# Altium integrated library vh_altium_library.intLib: 963 symbols (part 1 of 5)
Pins are listed as number, name and electrical type; pins without a type are passive.

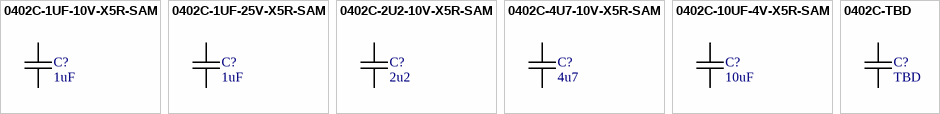
[diagram p0: symbols 0402C-1UF-10V-X5R-SAM to 0402C-TBD]

## 0402C-1UF-10V-X5R-SAM
designator C?, comment 1uF
CAPACITOR 0402 CERAMIC; Reel: C18
footprint 0402C-GENERIC
pins: 1, 2

## 0402C-1UF-25V-X5R-SAM
designator C?, comment 1uF
CAPACITOR 0402 CERAMIC; Reel: C49
footprint 0402C-GENERIC
pins: 1, 2

## 0402C-2U2-10V-X5R-SAM
designator C?, comment 2u2
CAPACITOR 0402 CERAMIC; Reel: C16
footprint 0402C-GENERIC
pins: 1, 2

## 0402C-4U7-10V-X5R-SAM
designator C?, comment 4u7
CAPACITOR 0402 CERAMIC; Reel: C48
footprint 0402C-GENERIC
pins: 1, 2

## 0402C-10UF-4V-X5R-SAM
designator C?, comment 10uF
CAPACITOR 0402 CERAMIC; Reel: C47
footprint 0402C-GENERIC
pins: 1, 2

## 0402C-TBD
designator C?, comment TBD
CAPACITOR 0402 CERAMIC
footprint 0402C-TBD (Footprint not found)
pins: 1, 2


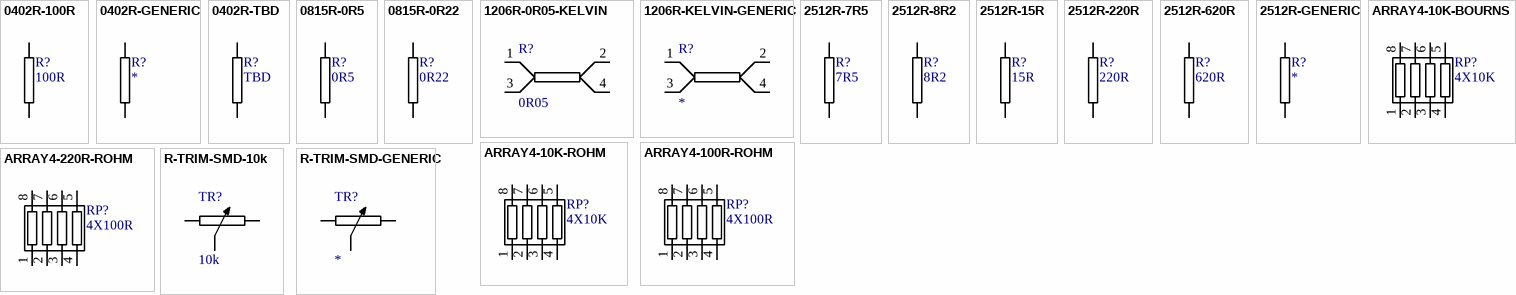
[diagram p1: symbols 0402R-100R to R-TRIM-SMD-GENERIC]

## 0402R-100R
designator R?, comment 100R
RESISTOR 0402 GENERIC
footprint 0402R-GENERIC
pins: 1, 2

## 0402R-GENERIC
designator R?
RESISTOR 0402 GENERIC
footprint 0402R-GENERIC
pins: 1, 2

## 0402R-TBD
designator R?, comment TBD
RESISTOR 0402 VALUE TO BE DETERMINED
footprint 0402R-TBD
pins: 1, 2

## 0815R-0R5
designator R?, comment 0R5
GENERIC RESISTOR 0815 1WATT
footprint 0815R-GENERIC (0815 RESISTOR 1 WATT)
pins: 1, 2

## 0815R-0R22
designator R?, comment 0R22
GENERIC RESISTOR 0815 1WATT
footprint 0815R-GENERIC (0815 RESISTOR 1 WATT)
pins: 1, 2

## 1206R-0R05-KELVIN
designator R?, comment 0R05
RESISTOR 1206 KELVIN; Manufacturer: Ohmite; Manufacturer Part Number: LVK12R050DER; Description: RES .05 OHM 1/2W .5% 4-TERM 1206; Supplier 1: Digi-Key; Supplier Part Number 1: LVK12R050DERTR-ND
footprint 1206-KELVIN-GENERIC
pins: 1, 2, 3, 4

## 1206R-KELVIN-GENERIC
designator R?
RESISTOR 1206 KELVIN
footprint 1206-KELVIN-GENERIC
pins: 1, 2, 3, 4

## 2512R-7R5
designator R?, comment 7R5
GENERIC RESISTOR 2512; Manufacturer Part Number: CRCW25127R50JNEG; Manufacturer: Vishay/Dale; REEL: R20; Description: RES 7.5 OHM 1W 5% 2512 SMD; Supplier 1: Digi-Key; Supplier Part Number 1: 541-7.5XDKR-ND
footprint 2512R-GENERIC
pins: 1, 2

## 2512R-8R2
designator R?, comment 8R2
GENERIC RESISTOR 2512; Manufacturer: Vishay/Dale; Manufacturer Part Number: CRCW25128R20JNEG; REEL: R10; Description: RES 8.2 OHM 1W 5% 2512 SMD; Supplier 1: Digi-Key; Supplier Part Number 1: 541-8.2XCT-ND
footprint 2512R-GENERIC
pins: 1, 2

## 2512R-15R
designator R?, comment 15R
GENERIC RESISTOR 2512; Manufacturer: Vishay/Dale; Manufacturer Part Number: CRCW251215R0JNEG; Reel: R11; Description: RES 15 OHM 1W 5% 2512 SMD; Supplier 1: Digi-Key; Supplier Part Number 1: 541-15XTR-ND
footprint 2512R-GENERIC
pins: 1, 2

## 2512R-220R
designator R?, comment 220R
GENERIC RESISTOR 2512; Manufacturer Part Number: CRCW2512220RJNEG; Manufacturer: Vishay/Dale; REEL: R19; Description: RES 220 OHM 1W 5% 2512 SMD; Supplier 1: Digi-Key; Supplier Part Number 1: 541-220XTR-ND
footprint 2512R-GENERIC
pins: 1, 2

## 2512R-620R
designator R?, comment 620R
GENERIC RESISTOR 2512; Manufacturer: Vishay/Dale; Manufacturer Part Number: CRCW2512620RJNEG; Description: RES 620 OHM 1W 5% 2512 SMD; Reel: R12; Supplier 1: Digi-Key; Supplier Part Number 1: 541-620XCT-ND
footprint 2512R-GENERIC
pins: 1, 2

## 2512R-GENERIC
designator R?
GENERIC RESISTOR 2512; Reel: *
footprint 2512R-GENERIC
pins: 1, 2

## ARRAY4-10K-BOURNS
designator RP?, comment 4X10K
GENERIC RESISTOR ARRAY 4X INDEPENDENT; Reel: RA4
footprint 1206-ARRAY-4-GENERIC
pins: 1, 2, 3, 4, 5, 6, 7, 8

## ARRAY4-10K-ROHM
designator RP?, comment 4X10K
GENERIC RESISTOR ARRAY 4X INDEPENDENT; Manufacturer: Rohm Semiconductor; Manufacturer Part Number: MNR14E0APJ103; Description: RES ARRAY 10K OHM 8TERM 4RES SMD; Temperature Coefficient: ±200ppm/°C; Resistance In Ohms: 10.0K; Number of Resistors: 4; Tolerance: ±5%; Circuit Type: Isolated; Power Per Element: 62.5mW; Reel: RA2; Supplier 1: Digi-Key; Supplier: Digi-Key; Category: Resistors; RoHS: RoHS Compliant; Package / Case: 0603 x 4 Convex (1608 metric); Packaging: Tape & Reel (TR); Mounting Type: Surface Mount; Number of Pins: 8; Supplier Part Number 1: MNR14103RTR-ND; Supplier Part Number: MNR14103RTR-ND
footprint 1206-ARRAY-4-GENERIC
pins: 1, 2, 3, 4, 5, 6, 7, 8

## ARRAY4-100R-ROHM
designator RP?, comment 4X100R
GENERIC RESISTOR ARRAY 4X INDEPENDENT; Manufacturer Part Number: MNR14E0APJ101; Manufacturer: Rohm Semiconductor; Description: RES ARRAY 100 OHM 8TERM 4RES SMD; Power Per Element: 62.5mW; Tolerance: ±5%; Number of Resistors: 4; Circuit Type: Isolated; Resistance In Ohms: 100; Temperature Coefficient: ±200ppm/°C; Reel: RA1; Supplier 1: Digi-Key; Category: Resistors; Number of Pins: 8; Mounting Type: Surface Mount; Supplier: Digi-Key; Package / Case: 0603 x 4 Convex (1608 metric); Packaging: Tape & Reel (TR); RoHS: RoHS Compliant; Supplier Part Number 1: MNR14101RTR-ND; Supplier Part Number: MNR14101RTR-ND
footprint 1206-ARRAY-4-GENERIC
pins: 1, 2, 3, 4, 5, 6, 7, 8

## ARRAY4-220R-ROHM
designator RP?, comment 4X100R
GENERIC RESISTOR ARRAY 4X INDEPENDENT; Manufacturer: Rohm Semiconductor; Manufacturer Part Number: MNR14E0APJ221; Description: RES ARRAY 220 OHM 8TERM 4RES SMD; Number of Resistors: 4; Resistance In Ohms: 220; Circuit Type: Isolated; Power Per Element: 62.5mW; Tolerance: ±5%; Temperature Coefficient: ±200ppm/°C; Reel: RA3; Supplier 1: Digi-Key; Category: Resistors; Supplier: Digi-Key; Number of Pins: 8; Packaging: Tape & Reel (TR); RoHS: RoHS Compliant; Mounting Type: Surface Mount; Package / Case: 0603 x 4 Convex (1608 metric); Supplier Part Number 1: MNR14221RTR-ND; Supplier Part Number: MNR14221RTR-ND
footprint 1206-ARRAY-4-GENERIC
pins: 1, 2, 3, 4, 5, 6, 7, 8

## R-TRIM-SMD-10k
designator TR?, comment 10k
GENERIC SMD TRIMMER; Manufacturer Part Number: 3224X-1-103E; Manufacturer: Bourns Inc.; Tolerance: ±10%; Power (Watts): 0.25W, 1/4W; Adjustment Type: Top Adjustment; Resistive Material: Cermet; Resistance In Ohms: 10.0K; Temperature Coefficient: ±100ppm/°C; Description: TRIMPOT 10K OHM 4MM CERMET SMD; Number of Turns: 11; Supplier 1: Digi-Key; Supplier Part Number 1: 3224X-1-103ETR-ND; Supplier: Digi-Key; Category: Potentiometers, Variable Resistors; Supplier Part Number: 3224X-1-103ETR-ND; Package / Case: Square - 0.190" L x 0.139" W x 0.200" H (4.80mm x 3.50mm x 5.10mm); Mounting Type: Surface Mount; RoHS: RoHS Compliant; Taper: -; Packaging: Tape & Reel (TR)
footprint TRIM3224
pins: 1, 2, W

## R-TRIM-SMD-GENERIC
designator TR?
GENERIC SMD TRIMMER
footprint TRIM3224
pins: 1, 2, W


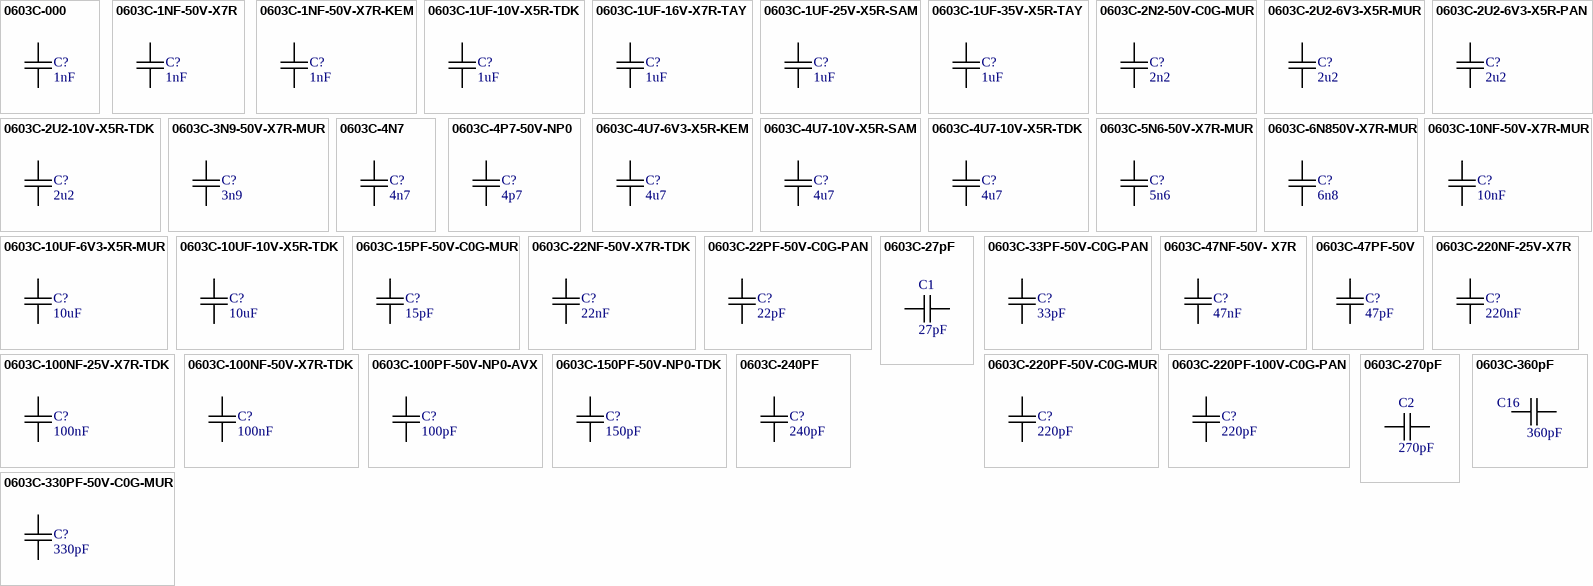
[diagram p2: symbols 0603C-000 to 0603C-360pF]

## 0603C-000
designator C?, comment 1nF
CAPACITOR 0603 CERAMIC
footprint 0603C-GENERIC (CAPACITOR 0805)
pins: 1, 2

## 0603C-1NF-50V-X7R
designator C?, comment 1nF
CAPACITOR 0603 CERAMIC
footprint 0603C-GENERIC (CAPACITOR 0805)
pins: 1, 2

## 0603C-1NF-50V-X7R-KEM
designator C?, comment 1nF
CAPACITOR 0603 CERAMIC; Reel: C45; Supplier 1: Digi-Key; Supplier Part Number 1: 399-1082-2-ND
footprint 0603C-GENERIC (CAPACITOR 0805)
pins: 1, 2

## 0603C-1UF-10V-X5R-TDK
designator C?, comment 1uF
CAPACITOR 0603 CERAMIC; Manufacturer: TDK Corporation; Manufacturer Part Number: C1608X5R1A105K; Reel: C23; Description: CAP CER 1.0UF 10V X5R 10% 0603; Supplier 1: Digi-Key; Supplier Part Number 1: 445-1321-2-ND
footprint 0603C-GENERIC (CAPACITOR 0805)
pins: 1, 2

## 0603C-1UF-16V-X7R-TAY
designator C?, comment 1uF
CAPACITOR 0603 CERAMIC; Manufacturer Part Number: EMK107B7105KA-T; Manufacturer: Taiyo Yuden; Reel: C37; Description: CAP CER 1.0UF 16V X7R 0603; Supplier 1: Digi-Key; Supplier Part Number 1: 587-1241-2-ND
footprint 0603C-GENERIC (CAPACITOR 0805)
pins: 1, 2

## 0603C-1UF-25V-X5R-SAM
designator C?, comment 1uF
CAPACITOR 0603 CERAMIC; Reel: C17
footprint 0603C-GENERIC (CAPACITOR 0805)
pins: 1, 2

## 0603C-1UF-35V-X5R-TAY
designator C?, comment 1uF
CAPACITOR 0603 CERAMIC; Manufacturer Part Number: GMK107BJ105KA-T; Manufacturer: Taiyo Yuden; Reel: C92; Description: CAP CER 1.0UF 35V X5R 0603; Supplier 1: Digi-Key; Supplier Part Number 1: 587-1437-2-ND
footprint 0603C-GENERIC (CAPACITOR 0603)
pins: 1, 2

## 0603C-2N2-50V-C0G-MUR
designator C?, comment 2n2
CAPACITOR 0603 CERAMIC; Reel: C4
footprint 0603C-GENERIC (CAPACITOR 0603)
pins: 1, 2

## 0603C-2U2-6V3-X5R-MUR
designator C?, comment 2u2
CAPACITOR 0603 CERAMIC; Reel: C20
footprint 0603C-2U2 (CAPACITOR 0603)
pins: 1, 2

## 0603C-2U2-6V3-X5R-PAN
designator C?, comment 2u2
CAPACITOR 0805 CERAMIC; Manufacturer Part Number: ECJ-1VB0J225K; Manufacturer: Panasonic - ECG; Description: CAP 2.2UF 6.3V CERAMIC X5R 0603; Supplier 1: Digi-Key; Supplier Part Number 1: PCC2273TR-ND; Reel: *
footprint 0805C-TBD (CAPACITOR 0805)
pins: 1, 2

## 0603C-2U2-10V-X5R-TDK
designator C?, comment 2u2
CAPACITOR 0603 CERAMIC; Manufacturer: TDK Corporation; Manufacturer Part Number: C1608X5R1A225K; Reel: C11; Description: CAP CER 2.2UF 10V X5R 0603; Supplier 1: Digi-Key; Supplier Part Number 1: 445-5166-2-ND
footprint 0603C-2U2 (CAPACITOR 0603)
pins: 1, 2

## 0603C-3N9-50V-X7R-MUR
designator C?, comment 3n9
CAPACITOR 0603 CERAMIC; Manufacturer Part Number: GRM188R71H392KA01D; Manufacturer: Murata Electronics North America; Reel: C39; Description: CAP CER 3900PF 50V 10% X7R 0603; Supplier 1: Digi-Key; Supplier Part Number 1: 490-1504-2-ND
footprint 0603C-GENERIC (CAPACITOR 0603)
pins: 1, 2

## 0603C-4N7
designator C?, comment 4n7
CAPACITOR 0603 CERAMIC; REEL: C83; Supplier 1: Digi-Key; Supplier Part Number 1: 445-5086-2-ND
footprint 0603C-TBD (CAPACITOR 0603 TBD)
pins: 1, 2

## 0603C-4P7-50V-NP0
designator C?, comment 4p7
CAPACITOR 0603 CERAMIC
footprint 0603C-GENERIC (CAPACITOR 0603)
pins: 1, 2

## 0603C-4U7-6V3-X5R-KEM
designator C?, comment 4u7
CAPACITOR 0603 CERAMIC; Reel: C36
footprint 0603C-GENERIC (CAPACITOR 0603)
pins: 1, 2

## 0603C-4U7-10V-X5R-SAM
designator C?, comment 4u7
CAPACITOR 0603 CERAMIC; Reel: C46
footprint 0603C-GENERIC (CAPACITOR 0603)
pins: 1, 2

## 0603C-4U7-10V-X5R-TDK
designator C?, comment 4u7
CAPACITOR 0603 CERAMIC; Manufacturer Part Number: C1608X5R1A475K; Manufacturer: TDK Corporation; Reel: C13; Temperature Coefficient: X5R; Description: CAP CER 4.7UF 10V X5R 0603; Voltage - Rated: 10V; Capacitance: 4.7µF; Tolerance: ±10%; Supplier 1: Digi-Key; Mounting Type: Surface Mount, MLCC; Operating Temperature: -55°C ~ 85°C; Features: General Purpose; Lead Spacing: -; Package / Case: 0603 (1608 metric); Thickness: 0.80mm; Packaging: Tape & Reel (TR); Category: Capacitors; Supplier: Digi-Key; RoHS: RoHS Compliant; Supplier Part Number 1: 445-5170-2-ND; Supplier Part Number: 445-5170-2-ND
footprint 0603C-GENERIC (CAPACITOR 0603)
pins: 1, 2

## 0603C-5N6-50V-X7R-MUR
designator C?, comment 5n6
CAPACITOR 0603 CERAMIC; Manufacturer: Murata Electronics North America; Manufacturer Part Number: GRM188R71H562KA01D; Reel: C34; Description: CAP CER 5600PF 50V 10% X7R 0603; Supplier 1: Digi-Key; Supplier Part Number 1: 490-1507-2-ND
footprint 0603C-GENERIC (CAPACITOR 0603)
pins: 1, 2

## 0603C-6N850V-X7R-MUR
designator C?, comment 6n8
CAPACITOR 0603 CERAMIC; Manufacturer: Murata Electronics North America; Manufacturer Part Number: GRM188R71H682KA01D; Reel: C35; Description: CAP CER 6800PF 50V 10% X7R 0603; Supplier 1: Digi-Key; Supplier Part Number 1: 490-1508-2-ND
footprint 0603C-GENERIC (CAPACITOR 0603)
pins: 1, 2

## 0603C-10NF-50V-X7R-MUR
designator C?, comment 10nF
CAPACITOR 0603 CERAMIC; Manufacturer Part Number: GRM188R71H103KA01D; Manufacturer: Murata Electronics North America; Reel: C22; Description: CAP CER 10000PF 50V 10% X7R 0603; Supplier 1: Digi-Key; Supplier Part Number 1: 490-1512-2-ND
footprint 0603C-GENERIC (CAPACITOR 0603)
pins: 1, 2

## 0603C-10UF-6V3-X5R-MUR
designator C?, comment 10uF
CAPACITOR 0603 CERAMIC; Manufacturer: Murata Electronics North America; Manufacturer Part Number: GRM188R60J106ME47D; Reel: C24; Description: CAP CER 10UF 6.3V X5R 0603; Supplier 1: Digi-Key; Supplier Part Number 1: 490-3896-2-ND
footprint 0603C-GENERIC (CAPACITOR 0603)
pins: 1, 2

## 0603C-10UF-10V-X5R-TDK
designator C?, comment 10uF
CAPACITOR 0603 CERAMIC; Manufacturer Part Number: C1608X5R0J106M; Manufacturer: TDK Corporation; Reel: C31; Description: CAP CER 10UF 6.3V X5R 20% 0603; Supplier 1: Digi-Key; Supplier Part Number 1: 445-4112-2-ND
footprint 0603C-GENERIC (CAPACITOR 0805)
pins: 1, 2

## 0603C-15PF-50V-C0G-MUR
designator C?, comment 15pF
CAPACITOR 0603 CERAMIC; Reel: C2
footprint 0603C-GENERIC (CAPACITOR 0805)
pins: 1, 2

## 0603C-22NF-50V-X7R-TDK
designator C?, comment 22nF
CAPACITOR 0603 CERAMIC; Reel: C89; Supplier 1: Digi-Key; Supplier Part Number 1: 445-1312-2-ND
footprint 0603C-GENERIC (CAPACITOR 0805)
pins: 1, 2

## 0603C-22PF-50V-C0G-PAN
designator C?, comment 22pF
CAPACITOR 0603 CERAMIC; Manufacturer Part Number: ECJ-1VC1H220J; Manufacturer: Panasonic - ECG; Reel: C10; Tolerance: ±5%; Temperature Coefficient: C0G, NP0; Voltage - Rated: 50V; Description: CAP CERAMIC 22PF 50V 0603 SMD; Supplier 1: Digi-Key; Features: General Purpose; Lead Spacing: -; Supplier: Digi-Key; Capacitance: 22pF; Packaging: Tape & Reel (TR); Mounting Type: Surface Mount, MLCC; RoHS: RoHS Compliant; Operating Temperature: -55°C ~ 125°C; Thickness: 0.80mm; Package / Case: 0603 (1608 metric); Category: Capacitors; Supplier Part Number 1: PCC220ACVTR-ND; Supplier Part Number: PCC220ACVTR-ND
footprint 0603C-GENERIC (CAPACITOR 0805)
pins: 1, 2

## 0603C-27pF
designator C1, comment 27pF
CAPACITOR 0603 CERAMIC; REEL: C98; Supplier 1: Digi-Key; Supplier Part Number 1: 445-1274-2-ND
footprint 0603C-GENERIC (CAPACITOR 0603)
pins: 1, 2

## 0603C-33PF-50V-C0G-PAN
designator C?, comment 33pF
CAPACITOR 0603 CERAMIC; Reel: C42
footprint 0603C-GENERIC (CAPACITOR 0805)
pins: 1, 2

## 0603C-47NF-50V- X7R
designator C?, comment 47nF
CAPACITOR 0603 CERAMIC
footprint 0603C-47NF (CAPACITOR 0603)
pins: 1, 2

## 0603C-47PF-50V
designator C?, comment 47pF
CAPACITOR 0603 CERAMIC; REEL: C82; Supplier 1: Digi-Key; Supplier Part Number 1: PCC470ACVTR-ND
footprint 0603C-TBD (CAPACITOR 0805)
pins: 1, 2

## 0603C-100NF-25V-X7R-TDK
designator C?, comment 100nF
CAPACITOR 0603 CERAMIC; Manufacturer Part Number: C1608X7R1E104K; Manufacturer: TDK Corporation; Reel: C12; Description: CAP CER .10UF 25V X7R 10% 0603; Supplier 1: Digi-Key; Supplier Part Number 1: 445-1316-2-ND
footprint 0603C-GENERIC (CAPACITOR 0805)
pins: 1, 2

## 0603C-100NF-50V-X7R-TDK
designator C?, comment 100nF
CAPACITOR 0603 CERAMIC; Manufacturer Part Number: C1608X7R1H103K; Manufacturer: TDK Corporation; Temperature Coefficient: X7R; Tolerance: ±10%; Voltage - Rated: 50V; Capacitance: 10000pF; Description: CAP CER 10000PF 50V X7R 10% 0603; Reel: C68; RoHS: RoHS Compliant; Lead Spacing: -; Package / Case: 0603 (1608 metric); Features: General Purpose; Packaging: Tape & Reel (TR); Thickness: 0.80mm; Operating Temperature: -55°C ~ 125°C; Mounting Type: Surface Mount, MLCC; Category: Capacitors; Supplier 1: Digi-Key; Supplier Part Number 1: 445-1314-2-ND
footprint 0603C-GENERIC (CAPACITOR 0805)
pins: 1, 2

## 0603C-100PF-50V-NP0-AVX
designator C?, comment 100pF
CAPACITOR 0603 CERAMIC; Reel: C44
footprint 0603C-GENERIC (CAPACITOR 0805)
pins: 1, 2

## 0603C-150PF-50V-NP0-TDK
designator C?, comment 150pF
CAPACITOR 0603 CERAMIC; Supplier 1: Digi-Key; Supplier Part Number 1: 445-1283-2-ND
footprint 0603C-GENERIC (CAPACITOR 0805)
pins: 1, 2

## 0603C-220NF-25V-X7R
designator C?, comment 220nF
CAPACITOR 0603 CERAMIC; Manufacturer: TDK Corporation; Manufacturer Part Number: C1608X7R1E224K; Temperature Coefficient: X7R; Tolerance: ±10%; Capacitance: 0.22µF; Voltage - Rated: 25V; Description: CAP CER .22UF 25V X7R 0603; REEL: C93; Supplier 1: Digi-Key; Supplier Part Number 1: 445-5191-2-ND; Lead Spacing: -; Packaging: Tape & Reel (TR); Category: Capacitors; Package / Case: 0603 (1608 Metric); Thickness: 0.80mm; Operating Temperature: -55°C ~ 125°C; Features: General Purpose; Supplier Part Number: 445-5191-2-ND; RoHS: RoHS Compliant; Supplier: Digi-Key; Mounting Type: Surface Mount, MLCC
footprint 0603C-GENERIC (CAPACITOR 0805)
pins: 1, 2

## 0603C-220PF-50V-C0G-MUR
designator C?, comment 220pF
CAPACITOR 0603 CERAMIC; Manufacturer: Murata Electronics North America; Manufacturer Part Number: GRM1885C1H221JA01D; Reel: C15; Tolerance: ±5%; Temperature Coefficient: C0G, NP0; Voltage - Rated: 50V; Description: CAP CER 220PF 50V 5% C0G 0603; Supplier 1: Digi-Key; RoHS: RoHS Compliant; Lead Spacing: -; Capacitance: 220pF; Supplier: Digi-Key; Features: General Purpose; Package / Case: 0603 (1608 metric); Packaging: Tape & Reel (TR); Operating Temperature: -55°C ~ 125°C; Category: Capacitors; Thickness: 0.80mm; Mounting Type: Surface Mount, MLCC; Supplier Part Number 1: 490-1435-2-ND; Supplier Part Number: 490-1435-2-ND
footprint 0603C-GENERIC (CAPACITOR 0805)
pins: 1, 2

## 0603C-220PF-100V-C0G-PAN
designator C?, comment 220pF
CAPACITOR 0603 CERAMIC; Reel: C41
footprint 0603C-GENERIC (CAPACITOR 0805)
pins: 1, 2

## 0603C-240PF
designator C?, comment 240pF
CAPACITOR 0603 CERAMIC; REEL: C95; Supplier 1: Digi-Key; Supplier Part Number 1: 490-1436-2-ND
footprint 0603C-TBD (CAPACITOR 0805)
pins: 1, 2

## 0603C-270pF
designator C2, comment 270pF
CAPACITOR 0603 CERAMIC; REEL: C99; Supplier 1: Digi-Key; Supplier Part Number 1: 490-1485-2-ND
footprint 0603C-GENERIC (CAPACITOR 0603)
pins: 1, 2

## 0603C-330PF-50V-C0G-MUR
designator C?, comment 330pF
CAPACITOR 0603 CERAMIC; Reel: C21; Supplier 1: Digi-Key; Supplier Part Number 1: 490-1439-2-ND
footprint 0603C-GENERIC (CAPACITOR 0805)
pins: 1, 2

## 0603C-360pF
designator C16, comment 360pF
CAPACITOR 0603 CERAMIC; REEL: C101; Supplier 1: Digi-Key; Supplier Part Number 1: 445-5067-2-ND
footprint 0603C-GENERIC (CAPACITOR 0603)
pins: 1, 2

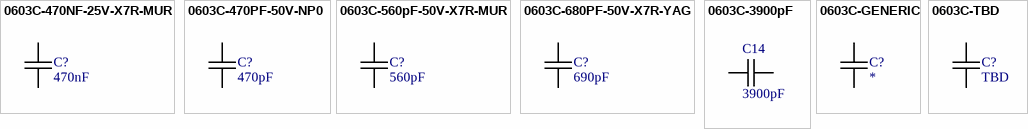
[diagram p3: symbols 0603C-470NF-25V-X7R-MUR to 0603C-TBD]

## 0603C-470NF-25V-X7R-MUR
designator C?, comment 470nF
CAPACITOR 0603 CERAMIC; Manufacturer: Murata Electronics North America; Manufacturer Part Number: GRM188R71E474KA12D; Reel: C14; Temperature Coefficient: X7R; Description: CAP CER .47UF 25V X7R 0603; Capacitance: 0.47µF; Voltage - Rated: 25V; Tolerance: ±10%; Supplier 1: Digi-Key; RoHS: RoHS Compliant; Features: General Purpose; Operating Temperature: -55°C ~ 125°C; Packaging: Tape & Reel (TR); Thickness: 0.80mm; Mounting Type: Surface Mount, MLCC; Lead Spacing: -; Category: Capacitors; Package / Case: 0603 (1608 metric); Supplier: Digi-Key; Supplier Part Number 1: 490-3291-2-ND; Supplier Part Number: 490-3291-2-ND
footprint 0603C-GENERIC (CAPACITOR 0805)
pins: 1, 2

## 0603C-470PF-50V-NP0
designator C?, comment 470pF
CAPACITOR 0603 CERAMIC; Manufacturer Part Number: 06035C471KAT2A; Manufacturer: AVX Corporation; Reel: C66; Description: CAP CERM 470PF 10% 50V X7R 0603; Supplier 1: Digi-Key; Supplier Part Number 1: 478-1211-2-ND
footprint 0603C-470P (CAPACITOR 0603)
pins: 1, 2

## 0603C-560pF-50V-X7R-MUR
designator C?, comment 560pF
CAPACITOR 0603 CERAMIC; REEL: C94; Supplier 1: Digi-Key; Supplier Part Number 1: 490-1490-2-ND
footprint 0603C-TBD (CAPACITOR 0805)
pins: 1, 2

## 0603C-680PF-50V-X7R-YAG
designator C?, comment 690pF
CAPACITOR 0603 CERAMIC; Manufacturer: Yageo; Manufacturer Part Number: CC0603KRX7R9BB681; Reel: C43; Description: CAP 680PF 50V CERAMIC X7R 0603; Supplier 1: Digi-Key; Supplier Part Number 1: 311-1188-2-ND
footprint 0603C-GENERIC (CAPACITOR 0805)
pins: 1, 2

## 0603C-3900pF
designator C14, comment 3900pF
CAPACITOR 0603 CERAMIC; REEL: C71; Supplier 1: Digi-Key; Supplier Part Number 1: PCC1779DKR-ND
footprint 0603C-GENERIC (CAPACITOR 0603)
pins: 1, 2

## 0603C-GENERIC
designator C?
CAPACITOR 0603 CERAMIC GENERIC
footprint 0603C-GENERIC (CAPACITOR 0805)
pins: 1, 2

## 0603C-TBD
designator C?, comment TBD
CAPACITOR 0603 CERAMIC VALUE TO BE DETERMINED; REEL: *
footprint 0603C-TBD (CAPACITOR 0805)
pins: 1, 2


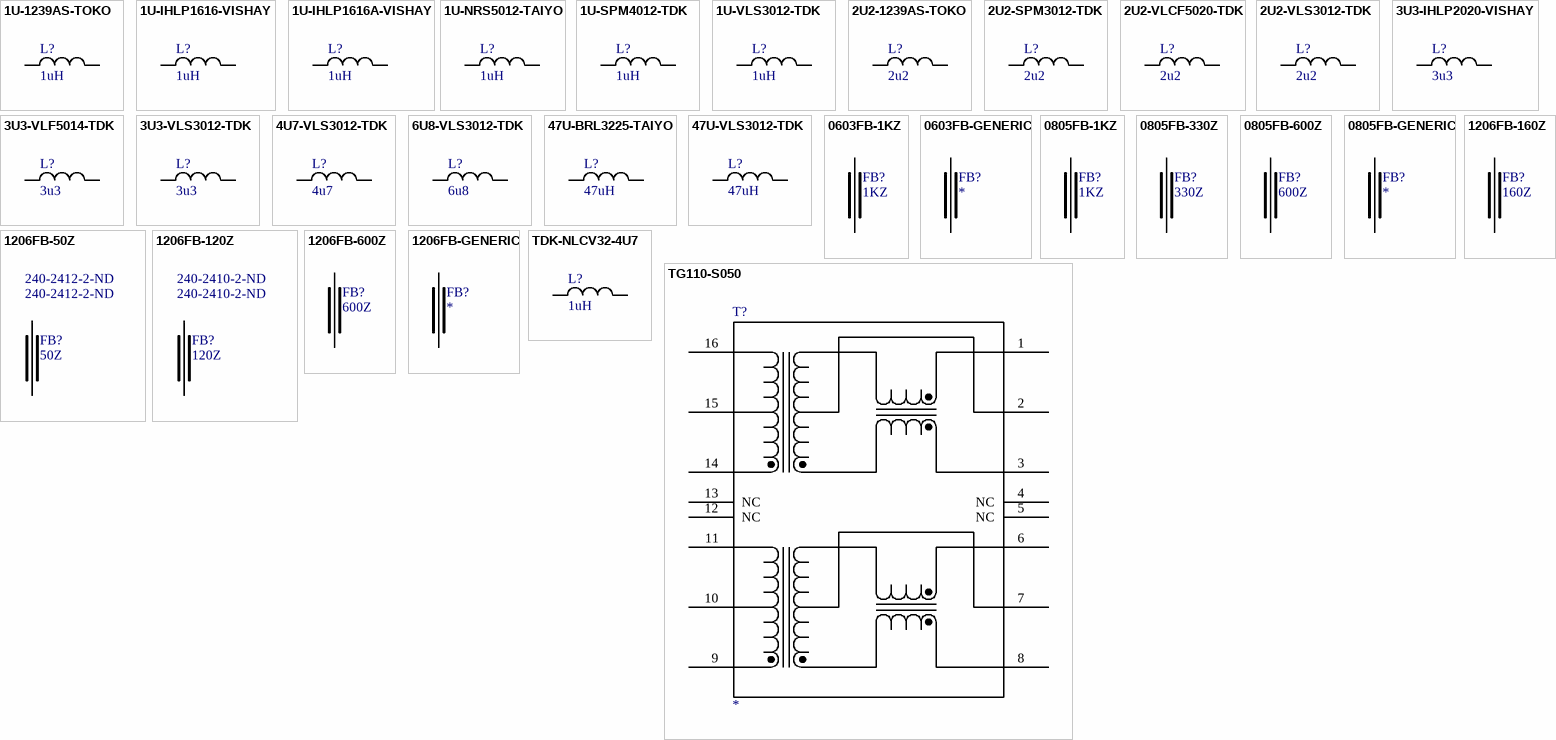
[diagram p4: symbols 1U-1239AS-TOKO to TG110-S050]

## 1U-1239AS-TOKO
designator L?, comment 1uH
1239AS-H-1R0N
footprint TOKO-DFE252012C-1U (TOKO INDUCTOR DFE252012 SERIES)
pins: 1, 2

## 1U-IHLP1616-VISHAY
designator L?, comment 1uH
1U-IHLP1616-VISHAY; Manufacturer Part Number: IHLP1616ABER1R0M01; Manufacturer: Vishay/Dale; Reel: L15; Description: INDUCTOR POWER 1.0UH 4.0A SMD; Supplier 1: Digi-Key; Supplier Part Number 1: 541-1043-2-ND
footprint VISHAY-IHLP1616-GENERIC
pins: 1, 2

## 1U-IHLP1616A-VISHAY
designator L?, comment 1uH
1U-IHLP1616A-VISHAY; Manufacturer Part Number: IHLP1616ABER1R0M11; Manufacturer: Vishay/Dale; Reel: L18; Description: INDUCTOR POWER 1.0UH 4.0A SMD; Supplier 1: Mouser; Supplier Part Number 1: 70-IHLP1616ABER1R0M1
footprint VISHAY-IHLP1616-GENERIC
pins: 1, 2

## 1U-NRS5012-TAIYO
designator L?, comment 1uH
1U-NRS5012
footprint TAIYO-NLS5012-GENERIC (TAIYO YUDEN NLS5012 BODY)
pins: 1, 2

## 1U-SPM4012-TDK
designator L?, comment 1uH
TDK-SPM4012-1U
footprint TDK-SPM4012T
pins: 1, 2

## 1U-VLS3012-TDK
designator L?, comment 1uH
TDK-VLS3012-1U; Manufacturer: TDK Corporation; Manufacturer Part Number: VLS3012T-1R0N2R2; Reel: L8; Description: INDUCTOR POWER 1.0UH 2.2A SMD; Supplier 1: Digi-Key; Supplier Part Number 1: 445-3682-2-ND
footprint TDK-VLS3012-1U
pins: 1, 2

## 2U2-1239AS-TOKO
designator L?, comment 2u2
1239AS-H-2R2N
footprint TOKO-DFE252012C-2U2 (TOKO INDUCTOR DFE252012 SERIES)
pins: 1, 2

## 2U2-SPM3012-TDK
designator L?, comment 2u2
TDK-SPM3012; Description: INDUCTOR POWER 2.2UH 2.1A SMD
footprint TDK-SPM3012T
pins: 1, 2

## 2U2-VLCF5020-TDK
designator L?, comment 2u2
TDK-VLCF5020-2U2; Manufacturer Part Number: VLS3012T-2R2M1R5; Manufacturer: TDK Corporation; Description: INDUCTOR POWER 2.2UH 1.5A SMD; Reel: L9; Supplier 1: Digi-Key; Supplier Part Number 1: 445-3684-2-ND
footprint TDK-VLCF5020-GENERIC
pins: 1, 2

## 2U2-VLS3012-TDK
designator L?, comment 2u2
TDK-VLS3012-2U2; Manufacturer Part Number: VLS3012T-2R2M1R5; Manufacturer: TDK Corporation; Description: INDUCTOR POWER 2.2UH 1.5A SMD; Reel: L9; Supplier 1: Digi-Key; Supplier Part Number 1: 445-3684-2-ND
footprint TDK-VLS3012-2U2
pins: 1, 2

## 3U3-IHLP2020-VISHAY
designator L?, comment 3u3
3U3 IHLP2020 VISHAY; Manufacturer Part Number: IHLP2020CZER3R3M11; Manufacturer: Vishay/Dale; Description: INDUCTOR POWER 3.3UH 5.5A SMD; Supplier 1: Digi-Key; Supplier Part Number 1: 541-1237-2-ND
footprint VISHAY-IHLP2020-GENERIC (Footprint not found)
pins: 1, 2

## 3U3-VLF5014-TDK
designator L?, comment 3u3
3U3 VLF5014 TDK; Reel: L17; Supplier 1: Digi-Key; Supplier Part Number 1: 445-4239-2-ND
footprint TDK-VLF5014-GENERIC
pins: 1, 2

## 3U3-VLS3012-TDK
designator L?, comment 3u3
TDK-VLS3012-3U3; Manufacturer Part Number: VLS3012T-3R3M1R3; Manufacturer: TDK Corporation; Reel: L10; Description: INDUCTOR POWER 3.3UH 1.3A SMD; Supplier 1: Digi-Key; Supplier Part Number 1: 445-3685-2-ND
footprint TDK-VLS3012-3U3 (Footprint not found)
pins: 1, 2

## 4U7-VLS3012-TDK
designator L?, comment 4u7
TDK-VLS3012-4u7; Manufacturer: TDK Corporation; Manufacturer Part Number: VLS3012T-4R7M1R0; Reel: L3; Description: INDUCTOR POWER 4.7UH 1.0A SMD; Supplier 1: Digi-Key; Supplier Part Number 1: 445-3686-6-ND
footprint TDK-VLS3012-4U7 (Footprint not found)
pins: 1, 2

## 6U8-VLS3012-TDK
designator L?, comment 6u8
TDK-VLS3012-6U8; Manufacturer: TDK Corporation; Manufacturer Part Number: VLS3012T-6R8MR90; Reel: L7; Description: INDUCTOR POWER 6.8UH .90A SMD; Supplier 1: Digi-Key; Supplier Part Number 1: 445-3687-2-ND
footprint TDK-VLS3012-6U8 (Footprint not found)
pins: 1, 2

## 47U-BRL3225-TAIYO
designator L?, comment 47uH
TY-BRL3225-47uH
footprint TAIYO-BRL3225-47U (TOKO INDUCTOR DFE252012 SERIES)
pins: 1, 2

## 47U-VLS3012-TDK
designator L?, comment 47uH
TDK-VLS3012-47uH; Manufacturer: TDK Corporation; Manufacturer Part Number: VLS3012T-470MR34; Reel: L6; Description: INDUCTOR POWER 47UH .34A SMD; Supplier 1: Digi-Key; Supplier Part Number 1: 445-3692-2-ND
footprint TDK-VLS3012-47U (Footprint not found)
pins: 1, 2

## 0603FB-1KZ
designator FB?, comment 1KZ
FERRITE BEAD 1000 OHM 400mA; Manufacturer: TDK Corporation; Manufacturer Part Number: MMZ1608R102A; Reel: F1; Description: FERRITE CHIP 1000 OHM 400MA 0603; Supplier 1: Digi-Key; Supplier Part Number 1: 445-1548-2-ND
footprint 0603FB-1KZ (Footprint not found)
pins: 1, 2

## 0603FB-GENERIC
designator FB?
FERRITE BEAD SMD
footprint 0603FB-GENERIC (Footprint not found)
pins: 1, 2

## 0805FB-1KZ
designator FB?, comment 1KZ
FERRITE BEAD 1000 OHM 6A; Reel: F3
footprint 0805FB-1KZ (Footprint not found)
pins: 1, 2

## 0805FB-330Z
designator FB?, comment 330Z
FERRITE BEAD 330 OHM 2.5A; Reel: F4
footprint 0805FB-330Z (Footprint not found)
pins: 1, 2

## 0805FB-600Z
designator FB?, comment 600Z
FERRITE BEAD 600 OHM 2A; Reel: F5
footprint 0805FB-600Z (Footprint not found)
pins: 1, 2

## 0805FB-GENERIC
designator FB?
FERRITE BEAD SMD
footprint 0805FB-GENERIC (Footprint not found)
pins: 1, 2

## 1206FB-50Z
designator FB?, comment 50Z  Supplier Part Number: 240-2412-2-ND
FERRITE BEAD 50 OHM 6A; Manufacturer: Laird-Signal Integrity Products; Manufacturer Part Number: HI1206T500R-10; Number of Lines: 1; Filter Type: Differential Mode - Single; Impedance @ Frequency: 50 Ohm @ 100MHz; DC Resistance (DCR): 10.00 mOhm Max; Description: FERRITE 6A 50 OHM 1206 SMD; Supplier: Digi-Key; Packaging: Tape & Reel (TR); Category: Filters; Current Rating: 6A; Package / Case: 1206 (3216 metric); RoHS: RoHS Compliant; Mounting Type: Surface Mount; Supplier 1: Digi-Key; Supplier Part Number 1: 240-2412-2-ND
footprint 1206FB-50Z
pins: 1, 2

## 1206FB-120Z
designator FB?, comment 120Z  Supplier Part Number: 240-2410-2-ND
FERRITE BEAD 120 OHM 4A; Manufacturer: Laird-Signal Integrity Products; Manufacturer Part Number: HI1206P121R-10; Number of Lines: 1; Filter Type: Differential Mode - Single; Impedance @ Frequency: 120 Ohm @ 100MHz; DC Resistance (DCR): 30.00 mOhm Max; Description: FERRITE CHIP 4A 120 OHM SMD; Supplier: Digi-Key; Packaging: Tape & Reel (TR); Category: Filters; Current Rating: 4A; Package / Case: 1206 (3216 metric); RoHS: RoHS Compliant; Mounting Type: Surface Mount; Supplier 1: Digi-Key; Supplier Part Number 1: 240-2410-2-ND
footprint 1206FB-120Z
pins: 1, 2

## 1206FB-160Z
designator FB?, comment 160Z
FERRITE BEAD 160 OHM 6A; Manufacturer Part Number: HI1206T161R-10; Manufacturer: Laird-Signal Integrity Products; Reel: F6; Description: FERRITE CHIP POWER 160 OHM SMD; Supplier 1: Digi-Key; Supplier Part Number 1: 240-2411-2-ND
footprint 1206FB-160Z (FERRITE BEAD 1206)
pins: 1, 2

## 1206FB-600Z
designator FB?, comment 600Z
FERRITE BEAD 600 OHM 500mA; Manufacturer: Laird-Signal Integrity Products; Manufacturer Part Number: HZ1206E601R-10; Number of Lines: 1; Filter Type: Differential Mode - Single; Impedance @ Frequency: 600 Ohm @ 100MHz; DC Resistance (DCR): 300.0 mOhm Max; Description: FERRITE 500MA 600 OHM 1206 SMD; Supplier 1: Digi-Key; Supplier: Digi-Key; Packaging: Cut Tape (CT); Category: Filters; Current Rating: 500mA; Package / Case: 1206 (3216 metric); RoHS: RoHS Compliant; Mounting Type: Surface Mount; Supplier Part Number 1: 240-2415-1-ND; Supplier Part Number: 240-2415-1-ND
footprint 1206FB-600Z
pins: 1, 2

## 1206FB-GENERIC
designator FB?
FERRITE BEAD 50 OHM 6A
footprint 1206FB-GENERIC
pins: 1, 2

## TDK-NLCV32-4U7
designator L?, comment 1uH
TDK-NLCV32-4U7; Supplier 1: Mouser; Supplier Part Number 1: 810-NLCV32T-4R7M-PFR
footprint 1210C-GENERIC
pins: 1, 2

## TG110-S050
designator T?
ETHERNET TX/RX TRANSFORMER
footprint TG110-S050
pins: 1, 2, 3, 4 NC, 5 NC, 6, 7, 8, 9, 10, 11, 12 NC, 13 NC, 14, 15, 16


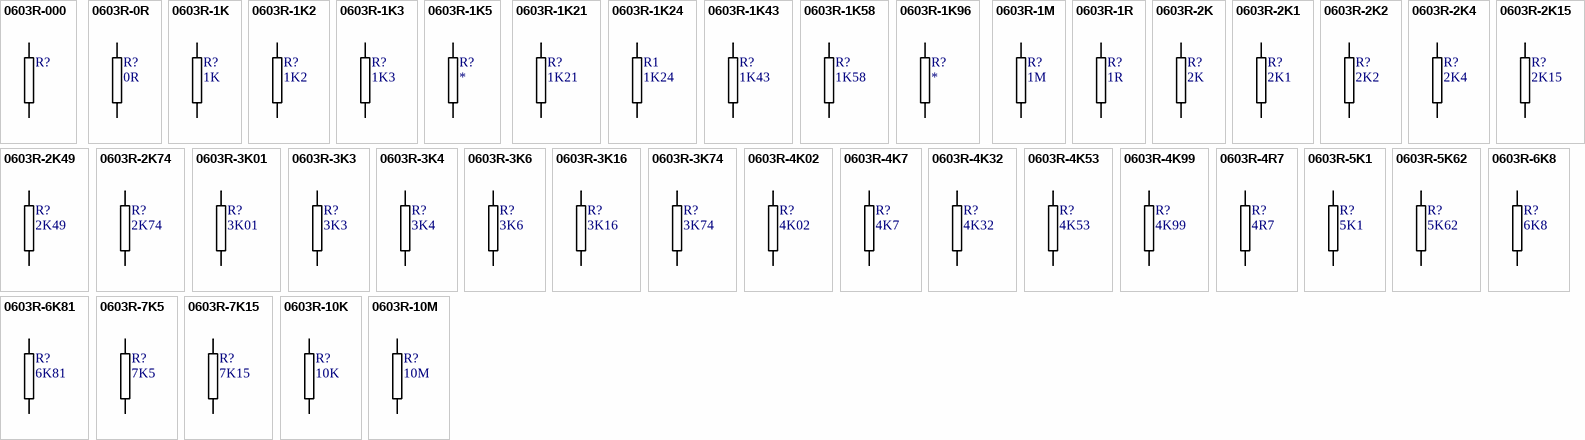
[diagram p5: symbols 0603R-000 to 0603R-10M]

## 0603R-000
designator R?
GENERIC RESISTOR 0603
footprint 0603R-GENERIC (RESISTOR 0603)
footprint 0603R-NI (RESISTOR 0603 NON INSTALLED)
pins: 1, 2

## 0603R-0R
designator R?, comment 0R
GENERIC JUMPER 0603; Manufacturer: Stackpole Electronics Inc; Manufacturer Part Number: RMC 1/16 0 G; Reel: R26; Supplier 1: Digi-Key; Supplier Part Number 1: RMCF0603ZT0R00TR-ND
footprint 0603R-0R (RESISTOR 0603)
footprint 0603R-NI (RESISTOR 0603 NON INSTALLED)
pins: 1, 2

## 0603R-1K
designator R?, comment 1K
GENERIC RESISTOR 0603; Manufacturer Part Number: RMCF 1/16 1K 1% R; Manufacturer: Stackpole Electronics Inc; Reel: R14; Supplier 1: Digi-Key; Supplier Part Number 1: RMCF0603FT1K00TR-ND
footprint 0603R-1k (RESISTOR 0603)
pins: 1, 2

## 0603R-1K2
designator R?, comment 1K2
GENERIC RESISTOR 0603; Manufacturer Part Number: RMCF 1/16 1.2K 1% R; Manufacturer: Stackpole Electronics Inc; Description: RES 1.2K OHM 1/10W 1% 0603 SMD; Reel: R75; Supplier 1: Digi-Key; Supplier Part Number 1: RMCF0603FT1K20TR-ND
footprint 0603R-GENERIC (RESISTOR 0603)
pins: 1, 2

## 0603R-1K3
designator R?, comment 1K3
GENERIC RESISTOR 0603; Supplier 1: Digi-Key; Supplier Part Number 1: RNCP0603FTD1K30CT-ND
footprint 0603R-GENERIC (RESISTOR 0603)
footprint 0603R-NI (RESISTOR 0603 NON INSTALLED)
pins: 1, 2

## 0603R-1K5
designator R?
GENERIC RESISTOR 0603; Manufacturer Part Number: RMCF 1/16 15K 1% R; Manufacturer: Stackpole Electronics Inc; Tolerance: ±1%; Resistance In Ohms: 15.0K; Power (Watts): 0.1W, 1/10W; Temperature Coefficient: ±100ppm/°C; Description: RES 15K OHM 1/10W 1% 0603 SMD; Supplier 1: Digi-Key; Supplier Part Number 1: RMCF1/1615KFRTR-ND; Supplier: Digi-Key; Supplier Part Number: RMCF1/1615KFRTR-ND; Packaging: Tape & Reel (TR); Category: Resistors; Case: 0603 (1608 metric); Composition: Thick Film; Lead Style: Surface Mount (SMD - SMT); RoHS: RoHS Compliant
footprint 0603R-1k5 (RESISTOR 0603)
pins: 1, 2

## 0603R-1K21
designator R?, comment 1K21